# Altium footprint library ubloxLib.PcbLib: 23 footprints (part 2 of 2)
Each footprint in its own frame and in the unit in brackets; x right, y up, seen from the top. Pads: shape width x height; smd on the part's side, far side on the other; paste and mask are expansions set on the pad; w line width, h text height; cw(c..) or ccw(c..) is an arc to the next point about the centre after c.
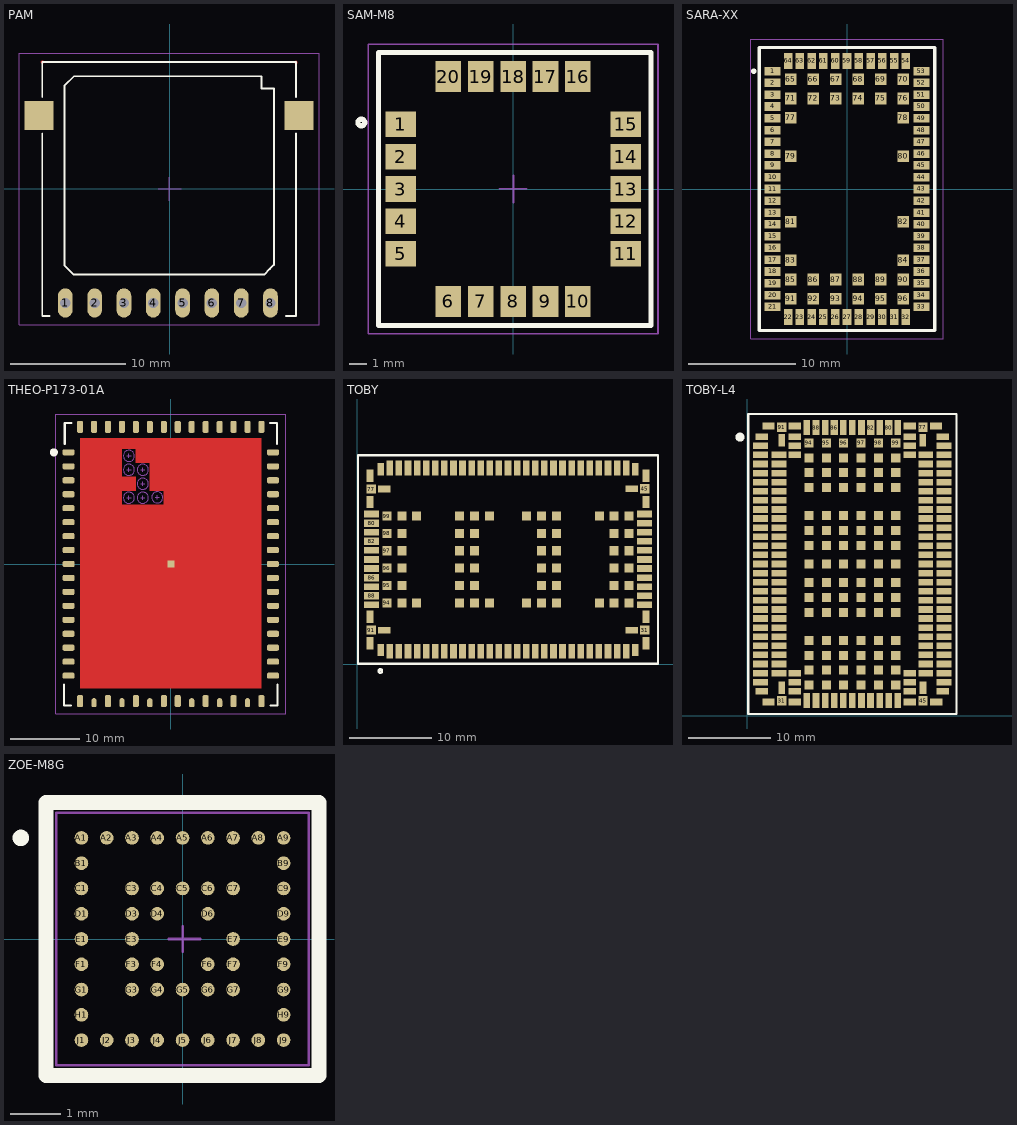
[diagram p1: the footprints below, top view; thin cyan lines are the x and y axes]

## PAM [mm] "u-blox PAM antenna module"
pads (10):
  oval 1.27x2.54 hole 0.9 paste-0.025: 1(-9.036,-9.876) 2(-6.496,-9.876) 3(-3.956,-9.876) 4(-1.416,-9.876) 5(1.124,-9.876) 6(3.664,-9.876) 7(6.204,-9.876) 8(8.744,-9.876)
  rect 2.5x2.5 smd paste-1.25: ""(-11.306,6.374) ""(11.204,6.374)
Top Layer:
  lines w0.254: -11.041,10.989 -10.991,10.989 ; 10.939,10.939 10.939,10.989
Top Overlay:
  lines w0.16: -11.036,4.799 -11.036,-11.001 -10.411,-11.001 ; -11.036,7.949 -11.036,10.999 10.964,10.999 10.964,7.949 ; 7.964,9.074 7.964,9.774 ; 7.964,9.149 7.964,8.699 9.039,8.699 9.039,-6.576 8.689,-6.926 8.195,-7.42 -8.292,-7.42 -9.111,-6.601 -9.111,8.949 -8.286,9.774 7.964,9.774 ; 10.089,-11.001 10.964,-11.001 10.964,4.799 ; 7.964,9.774 7.964,9.774
Mechanical 15:
  lines w0.1: -1,0.01 -0.01,0.01 ; -0.01,-1 -0.01,0.01 ; -0.01,1 -0.01,0.01 ; 1,0.01 -0.01,0.01 ; -13.051,-11.751 -13.051,11.749 12.949,11.749 12.949,-11.751 -13.051,-11.751
3D body "PAM.STEP": height 7.66, standoff -0.04, extent -11.036,-11.001 10.964,10.999

## SAM-M8 [mm] "ublox SAM antenna module"
pads (20):
  rect 1.8x1.5 smd paste-1.8: 1(-6.6,3.8) 2(-6.6,1.9) 3(-6.6,0) 4(-6.6,-1.9) 5(-6.6,-3.8) 11(6.6,-3.8) 12(6.6,-1.9) 13(6.6,0) 14(6.6,1.9) 15(6.6,3.8)
  rect 1.5x1.8 smd paste-1.8: 6(-3.8,-6.6) 7(-1.9,-6.6) 8(0,-6.6) 9(1.9,-6.6) 10(3.8,-6.6) 16(3.8,6.6) 17(1.9,6.6) 18(0,6.6) 19(-1.9,6.6) 20(-3.8,6.6)
Top Overlay:
  circle w0.3: c-8.9,3.9 r0.2
  lines w0.3: -7.9,-8 -7.9,0.125 -7.9,8 8.1,8 8.1,0.35 8.1,-8 -0.226,-8 -7.9,-8
Top Paste:
  region: 7.467,-0.136 6.748,-0.136 6.748,-0.716 7.467,-0.716
  region: 7.463,0.701 6.744,0.701 6.744,0.121 7.463,0.121
  region: 6.449,-0.132 5.73,-0.132 5.73,-0.712 6.449,-0.712
  region: 6.449,0.698 5.73,0.698 5.73,0.118 6.449,0.118
  region: 7.467,-3.933 6.748,-3.933 6.748,-4.513 7.467,-4.513
  region: 7.463,-3.096 6.744,-3.096 6.744,-3.676 7.463,-3.676
  region: 6.449,-3.929 5.73,-3.929 5.73,-4.509 6.449,-4.509
  region: 6.449,-3.099 5.73,-3.099 5.73,-3.679 6.449,-3.679
  region: -5.731,-0.136 -6.45,-0.136 -6.45,-0.716 -5.731,-0.716
  region: -5.735,0.701 -6.454,0.701 -6.454,0.121 -5.735,0.121
  region: -6.749,-0.132 -7.468,-0.132 -7.468,-0.712 -6.749,-0.712
  region: -6.749,0.698 -7.468,0.698 -7.468,0.118 -6.749,0.118
  region: 4.499,6.75 4.499,7.469 3.919,7.469 3.919,6.75
  region: 3.669,6.75 3.669,7.469 3.089,7.469 3.089,6.75
  region: 4.502,5.736 4.502,6.455 3.922,6.455 3.922,5.736
  region: 3.665,5.732 3.665,6.451 3.085,6.451 3.085,5.732
  region: 0.703,6.75 0.703,7.469 0.123,7.469 0.123,6.75
  region: -0.127,6.75 -0.127,7.469 -0.707,7.469 -0.707,6.75
  region: 0.706,5.736 0.706,6.455 0.126,6.455 0.126,5.736
  region: -0.131,5.732 -0.131,6.451 -0.711,6.451 -0.711,5.732
  region: -3.103,6.75 -3.103,7.469 -3.683,7.469 -3.683,6.75
  region: -3.933,6.75 -3.933,7.469 -4.513,7.469 -4.513,6.75
  region: -3.1,5.736 -3.1,6.455 -3.68,6.455 -3.68,5.736
  region: -3.937,5.732 -3.937,6.451 -4.517,6.451 -4.517,5.732
  region: 4.5,-6.455 4.5,-5.736 3.92,-5.736 3.92,-6.455
  region: 3.67,-6.455 3.67,-5.736 3.09,-5.736 3.09,-6.455
  region: 4.503,-7.469 4.503,-6.75 3.923,-6.75 3.923,-7.469
  region: 3.666,-7.473 3.666,-6.754 3.086,-6.754 3.086,-7.473
  region: 1.77,-7.464 1.77,-6.745 1.19,-6.745 1.19,-7.464
  region: 2.607,-7.46 2.607,-6.741 2.027,-6.741 2.027,-7.46
  region: 1.774,-6.446 1.774,-5.727 1.194,-5.727 1.194,-6.446
  region: 2.604,-6.446 2.604,-5.727 2.024,-5.727 2.024,-6.446
  region: -3.932,-7.473 -3.932,-6.754 -4.512,-6.754 -4.512,-7.473
  region: -3.095,-7.469 -3.095,-6.75 -3.675,-6.75 -3.675,-7.469
  region: -3.928,-6.455 -3.928,-5.736 -4.508,-5.736 -4.508,-6.455
  region: -3.098,-6.455 -3.098,-5.736 -3.678,-5.736 -3.678,-6.455
  region: -1.198,-6.448 -1.198,-5.729 -1.778,-5.729 -1.778,-6.448
  region: -2.028,-6.448 -2.028,-5.729 -2.608,-5.729 -2.608,-6.448
  region: -1.195,-7.462 -1.195,-6.743 -1.775,-6.743 -1.775,-7.462
  region: -2.032,-7.466 -2.032,-6.747 -2.612,-6.747 -2.612,-7.466
  region: 0.708,-6.455 0.708,-5.736 0.128,-5.736 0.128,-6.455
  region: -0.122,-6.455 -0.122,-5.736 -0.702,-5.736 -0.702,-6.455
  region: 0.711,-7.469 0.711,-6.75 0.131,-6.75 0.131,-7.469
  region: -0.126,-7.473 -0.126,-6.754 -0.706,-6.754 -0.706,-7.473
  region: -2.027,5.723 -2.027,6.442 -2.607,6.442 -2.607,5.723
  region: -1.19,5.727 -1.19,6.446 -1.77,6.446 -1.77,5.727
  region: -2.023,6.741 -2.023,7.46 -2.603,7.46 -2.603,6.741
  region: -1.193,6.741 -1.193,7.46 -1.773,7.46 -1.773,6.741
  region: 1.76,5.728 1.76,6.447 1.18,6.447 1.18,5.728
  region: 2.597,5.732 2.597,6.451 2.017,6.451 2.017,5.732
  region: 1.764,6.746 1.764,7.465 1.184,7.465 1.184,6.746
  region: 2.594,6.746 2.594,7.465 2.014,7.465 2.014,6.746
  region: -5.731,3.674 -6.45,3.674 -6.45,3.094 -5.731,3.094
  region: -5.735,4.511 -6.454,4.511 -6.454,3.931 -5.735,3.931
  region: -6.749,3.678 -7.468,3.678 -7.468,3.098 -6.749,3.098
  region: -6.749,4.508 -7.468,4.508 -7.468,3.928 -6.749,3.928
  region: -6.749,2.603 -7.468,2.603 -7.468,2.023 -6.749,2.023
  region: -6.749,1.773 -7.468,1.773 -7.468,1.193 -6.749,1.193
  region: -5.735,2.606 -6.454,2.606 -6.454,2.026 -5.735,2.026
  region: -5.731,1.769 -6.45,1.769 -6.45,1.189 -5.731,1.189
  region: -6.749,-1.203 -7.468,-1.203 -7.468,-1.783 -6.749,-1.783
  region: -6.749,-2.033 -7.468,-2.033 -7.468,-2.613 -6.749,-2.613
  region: -5.735,-1.2 -6.454,-1.2 -6.454,-1.78 -5.735,-1.78
  region: -5.731,-2.037 -6.45,-2.037 -6.45,-2.617 -5.731,-2.617
  region: -6.749,-3.099 -7.468,-3.099 -7.468,-3.679 -6.749,-3.679
  region: -6.749,-3.929 -7.468,-3.929 -7.468,-4.509 -6.749,-4.509
  region: -5.735,-3.096 -6.454,-3.096 -6.454,-3.676 -5.735,-3.676
  region: -5.731,-3.933 -6.45,-3.933 -6.45,-4.513 -5.731,-4.513
  region: 6.449,-1.203 5.73,-1.203 5.73,-1.783 6.449,-1.783
  region: 6.449,-2.033 5.73,-2.033 5.73,-2.613 6.449,-2.613
  region: 7.463,-1.2 6.744,-1.2 6.744,-1.78 7.463,-1.78
  region: 7.467,-2.037 6.748,-2.037 6.748,-2.617 7.467,-2.617
  region: 6.449,2.603 5.73,2.603 5.73,2.023 6.449,2.023
  region: 6.449,1.773 5.73,1.773 5.73,1.193 6.449,1.193
  region: 7.463,2.606 6.744,2.606 6.744,2.026 7.463,2.026
  region: 7.467,1.769 6.748,1.769 6.748,1.189 7.467,1.189
  region: 6.453,4.499 5.734,4.499 5.734,3.919 6.453,3.919
  region: 6.453,3.669 5.734,3.669 5.734,3.089 6.453,3.089
  region: 7.467,4.502 6.748,4.502 6.748,3.922 7.467,3.922
  region: 7.471,3.665 6.752,3.665 6.752,3.085 7.471,3.085
Mechanical 15:
  lines w0.1: -0.8,0.017 0.028,0.017 ; 0.028,-0.8 0.028,0.017 ; 0.028,0.8 0.028,0.017 ; 0.8,0.017 0.028,0.017 ; -8.5,-8.5 -8.5,8.5 8.5,8.5 8.5,-8.5 -8.5,-8.5
3D body "SAM_AP214.STEP": height 6.41, standoff 0.03, extent -7.7,-7.75 7.8,7.75

## SARA-XX [mm] "GSM/GPRS and GSM/EGPRS/HSPA Cellular Module"
height 3.25
pads (96):
  rect 1.5x0.8 smd paste-1: 1(-6.95,11) 2(-6.95,9.9) 3(-6.95,8.8) 4(-6.95,7.7) 5(-6.95,6.6) 6(-6.95,5.5) 7(-6.95,4.4) 8(-6.95,3.3) 9(-6.95,2.2) 10(-6.95,1.1) 11(-6.95,0) 12(-6.95,-1.1) 13(-6.95,-2.2) 14(-6.95,-3.3) 15(-6.95,-4.4) 16(-6.95,-5.5) 17(-6.95,-6.6) 18(-6.95,-7.7) 19(-6.95,-8.8) 20(-6.95,-9.9) 21(-6.95,-11) 33(6.95,-11) 34(6.95,-9.9) 35(6.95,-8.8) 36(6.95,-7.7) 37(6.95,-6.6) 38(6.95,-5.5) 39(6.95,-4.4) 40(6.95,-3.3) 41(6.95,-2.2) 42(6.95,-1.1) 43(6.95,0) 44(6.95,1.1) 45(6.95,2.2) 46(6.95,3.3) 47(6.95,4.4) 48(6.95,5.5) 49(6.95,6.6) 50(6.95,7.7) 51(6.95,8.8) 52(6.95,9.9) 53(6.95,11)
  rect 0.8x1.5 smd paste-1: 22(-5.5,-11.95) 23(-4.4,-11.95) 24(-3.3,-11.95) 25(-2.2,-11.95) 26(-1.1,-11.95) 27(0,-11.95) 28(1.1,-11.95) 29(2.2,-11.95) 30(3.3,-11.95) 31(4.4,-11.95) 32(5.5,-11.95) 54(5.5,11.95) 55(4.4,11.95) 56(3.3,11.95) 57(2.2,11.95) 58(1.1,11.95) 59(0,11.95) 60(-1.1,11.95) 61(-2.2,11.95) 62(-3.3,11.95) 63(-4.4,11.95) 64(-5.5,11.95)
  rect 1.1x1.1 smd paste-0.025: 65(-5.25,10.25) 66(-3.15,10.25) 67(-1.05,10.25) 68(1.05,10.25) 69(3.15,10.25) 70(5.25,10.25) 71(-5.25,8.45) 72(-3.15,8.45) 73(-1.05,8.45) 74(1.05,8.45) 75(3.15,8.45) 76(5.25,8.45) 77(-5.25,6.65) 78(5.25,6.65) 79(-5.25,3.05) 80(5.25,3.05) 81(-5.25,-3.05) 82(5.25,-3.05) 83(-5.25,-6.65) 84(5.25,-6.65) 85(-5.25,-8.45) 86(-3.15,-8.45) 87(-1.05,-8.45) 88(1.05,-8.45) 89(3.15,-8.45) 90(5.25,-8.45) 91(-5.25,-10.25) 92(-3.15,-10.25) 93(-1.05,-10.25) 94(1.05,-10.25) 95(3.15,-10.25) 96(5.25,-10.25)
Top Overlay:
  circle w0.4: c-8.7,11 r0.05
  lines w0.3: -8.2,-13.2 8.2,-13.2 8.2,13.2 -8.2,13.2 -8.2,-13.2
Top Paste:
  rectangle: -7.775,10.625 -6.225,11.375
  rectangle: -7.775,9.525 -6.225,10.275
  rectangle: -7.775,8.425 -6.225,9.175
  rectangle: -7.775,7.325 -6.225,8.075
  rectangle: -7.775,6.225 -6.225,6.975
  rectangle: -7.775,5.125 -6.225,5.875
  rectangle: -7.775,4.025 -6.225,4.775
  rectangle: -7.775,2.925 -6.225,3.675
  rectangle: -7.775,1.825 -6.225,2.575
  rectangle: -7.775,0.725 -6.225,1.475
  rectangle: -7.775,-0.375 -6.225,0.375
  rectangle: -7.775,-1.475 -6.225,-0.725
  rectangle: -7.775,-2.575 -6.225,-1.825
  rectangle: -7.775,-3.675 -6.225,-2.925
  rectangle: -7.775,-4.775 -6.225,-4.025
  rectangle: -7.775,-5.875 -6.225,-5.125
  rectangle: -7.775,-6.975 -6.225,-6.225
  rectangle: -7.775,-8.075 -6.225,-7.325
  rectangle: -7.775,-9.175 -6.225,-8.425
  rectangle: -7.775,-10.275 -6.225,-9.525
  rectangle: -7.775,-11.375 -6.225,-10.625
  region: -5.125,-12.775 -5.125,-11.225 -5.875,-11.225 -5.875,-12.775
  region: -4.025,-12.775 -4.025,-11.225 -4.775,-11.225 -4.775,-12.775
  region: -2.925,-12.775 -2.925,-11.225 -3.675,-11.225 -3.675,-12.775
  region: -1.825,-12.775 -1.825,-11.225 -2.575,-11.225 -2.575,-12.775
  region: -0.725,-12.775 -0.725,-11.225 -1.475,-11.225 -1.475,-12.775
  region: 0.375,-12.775 0.375,-11.225 -0.375,-11.225 -0.375,-12.775
  region: 1.475,-12.775 1.475,-11.225 0.725,-11.225 0.725,-12.775
  region: 2.575,-12.775 2.575,-11.225 1.825,-11.225 1.825,-12.775
  region: 3.675,-12.775 3.675,-11.225 2.925,-11.225 2.925,-12.775
  region: 4.775,-12.775 4.775,-11.225 4.025,-11.225 4.025,-12.775
  region: 5.875,-12.775 5.875,-11.225 5.125,-11.225 5.125,-12.775
  rectangle: 6.225,-11.375 7.775,-10.625
  rectangle: 6.225,-10.275 7.775,-9.525
  rectangle: 6.225,-9.175 7.775,-8.425
  rectangle: 6.225,-8.075 7.775,-7.325
  rectangle: 6.225,-6.975 7.775,-6.225
  rectangle: 6.225,-5.875 7.775,-5.125
  rectangle: 6.225,-4.775 7.775,-4.025
  rectangle: 6.225,-3.675 7.775,-2.925
  rectangle: 6.225,-2.575 7.775,-1.825
  rectangle: 6.225,-1.475 7.775,-0.725
  rectangle: 6.225,-0.375 7.775,0.375
  rectangle: 6.225,0.725 7.775,1.475
  rectangle: 6.225,1.825 7.775,2.575
  rectangle: 6.225,2.925 7.775,3.675
  rectangle: 6.225,4.025 7.775,4.775
  rectangle: 6.225,5.125 7.775,5.875
  rectangle: 6.225,6.225 7.775,6.975
  rectangle: 6.225,7.325 7.775,8.075
  rectangle: 6.225,8.425 7.775,9.175
  rectangle: 6.225,9.525 7.775,10.275
  rectangle: 6.225,10.625 7.775,11.375
  region: 4.775,11.225 4.775,12.775 4.025,12.775 4.025,11.225
  region: 3.675,11.225 3.675,12.775 2.925,12.775 2.925,11.225
  region: 2.575,11.225 2.575,12.775 1.825,12.775 1.825,11.225
  region: 5.875,11.225 5.875,12.775 5.125,12.775 5.125,11.225
  region: 1.475,11.225 1.475,12.775 0.725,12.775 0.725,11.225
  region: 0.375,11.225 0.375,12.775 -0.375,12.775 -0.375,11.225
  region: -0.725,11.225 -0.725,12.775 -1.475,12.775 -1.475,11.225
  region: -1.825,11.225 -1.825,12.775 -2.575,12.775 -2.575,11.225
  region: -2.925,11.225 -2.925,12.775 -3.675,12.775 -3.675,11.225
  region: -4.025,11.225 -4.025,12.775 -4.775,12.775 -4.775,11.225
  region: -5.125,11.225 -5.125,12.775 -5.875,12.775 -5.875,11.225
Mechanical 15:
  lines w0.05: -9,-14 9,-14 9,14 -9,14 -9,-14
3D body "SARA.STEP": height 3.13, standoff 0.13, extent -8,-13 8,13
3D body "SARA.STEP": height 0.13, standoff -2.87, extent -8,-13.05 8,12.95

## THEO-P173-01A [mm] "Host-based V2X transceiver module"
height 3.5
pads (69):
  rrect50% 1.7x0.87 smd: 1(-14.65,16) 2(-14.65,14) 3(-14.65,12) 4(-14.65,10) 5(-14.65,8) 6(-14.65,6) 7(-14.65,4) 8(-14.65,2) 9(-14.65,0) 10(-14.65,-2) 11(-14.65,-4) 12(-14.65,-6) 13(-14.65,-8) 14(-14.65,-10) 15(-14.65,-12) 16(-14.65,-14) 17(-14.65,-16) 32(14.65,-16) 33(14.65,-14) 34(14.65,-12) 35(14.65,-10) 36(14.65,-8) 37(14.65,-6) 38(14.65,-4) 39(14.65,-2) 40(14.65,0) 41(14.65,2) 42(14.65,4) 43(14.65,6) 44(14.65,8) 45(14.65,10) 46(14.65,12) 47(14.65,14) 48(14.65,16)
  rrect50% 0.87x1.7 smd: 18(-13,-19.65) 20(-9,-19.65) 22(-5,-19.65) 24(-1,-19.65) 25(1,-19.65) 27(5,-19.65) 29(9,-19.65) 31(13,-19.65) 49(13,19.65) 50(11,19.65) 51(9,19.65) 52(7,19.65) 53(5,19.65) 54(3,19.65) 55(1,19.65) 56(-1,19.65) 57(-3,19.65) 58(-5,19.65) 59(-7,19.65) 60(-9,19.65) 61(-11,19.65) 62(-13,19.65)
  rrect50% 0.76x1.1 smd: 19(-11,-19.95) 21(-7,-19.95) 23(-3,-19.95) 26(3,-19.95) 28(7,-19.95) 30(11,-19.95)
  round 0.76 smd: 19(-11,-19.6) 21(-7,-19.6) 23(-3,-19.6) 26(3,-19.6) 28(7,-19.6) 30(11,-19.6)
  rect 1x1 smd paste-1: GND_TAB(0,0)
Top Layer:
  region: -13,18 13,18 13,-17.8 -1,-17.8 -1,10.5 -3,10.5 -3,14.5 -5,14.5 -5,16.5 -7,16.5 -7,12.5 -5,12.5 -5,10.5 -7,10.5 -7,8.5 -1,8.5 -1,-17.8 -13,-17.8
Top Overlay:
  circle w0.635: c-16.754,16 r0.254
  lines w0.3: -15.3,-17.3 -15.3,-20.3 -14.3,-20.3 ; -15.2,17.2 -15.2,20.2 -14.2,20.2 ; 14.2,20.2 15.2,20.2 15.2,17.2 ; 14.3,-20.3 15.3,-20.3 15.3,-17.3
Top Paste:
  rectangle: -6.5,-2.3 -4.5,-0.3
  rectangle: -3.5,-2.3 -1.5,-0.3
  rectangle: -3.5,-5.3 -1.5,-3.3
  rectangle: -6.5,-5.3 -4.5,-3.3
  rectangle: -3.5,-8.3 -1.5,-6.3
  rectangle: -6.5,-8.3 -4.5,-6.3
  rectangle: -6.5,-17.3 -4.5,-15.3
  rectangle: -3.5,-17.3 -1.5,-15.3
  rectangle: -6.5,-14.3 -4.5,-12.3
  rectangle: -3.5,-14.3 -1.5,-12.3
  rectangle: -3.5,-11.3 -1.5,-9.3
  rectangle: -6.5,-11.3 -4.5,-9.3
  rectangle: -6.5,6.5 -4.5,8
  rectangle: -3.5,6.5 -1.5,8
  rectangle: -3.5,3.5 -1.5,5.5
  rectangle: -6.5,3.5 -4.5,5.5
  rectangle: -3.5,0.5 -1.5,2.5
  rectangle: -6.5,0.5 -4.5,2.5
  rectangle: -6.5,11 -5.5,11.5
  rectangle: -2.5,12.5 -1.5,14.5
  rectangle: -3.5,15.5 -1.5,17.5
  rectangle: -6.5,17 -4.5,17.5
  rectangle: -12.5,15.5 -10.5,17.5
  rectangle: -9.5,15.5 -7.5,17.5
  rectangle: -9.5,12.5 -7.5,14.5
  rectangle: -12.5,12.5 -10.5,14.5
  rectangle: -9.5,9.5 -7.5,11.5
  rectangle: -12.5,9.5 -10.5,11.5
  rectangle: -12.5,0.5 -10.5,2.5
  rectangle: -9.5,0.5 -7.5,2.5
  rectangle: -12.5,3.5 -10.5,5.5
  rectangle: -9.5,3.5 -7.5,5.5
  rectangle: -9.5,6.5 -7.5,8.5
  rectangle: -12.5,6.5 -10.5,8.5
  rectangle: -12.5,-11.3 -10.5,-9.3
  rectangle: -9.5,-11.3 -7.5,-9.3
  rectangle: -9.5,-14.3 -7.5,-12.3
  rectangle: -12.5,-14.3 -10.5,-12.3
  rectangle: -9.5,-17.3 -7.5,-15.3
  rectangle: -12.5,-17.3 -10.5,-15.3
  rectangle: -12.5,-8.3 -10.5,-6.3
  rectangle: -9.5,-8.3 -7.5,-6.3
  rectangle: -12.5,-5.3 -10.5,-3.3
  rectangle: -9.5,-5.3 -7.5,-3.3
  rectangle: -9.5,-2.3 -7.5,-0.3
  rectangle: -12.5,-2.3 -10.5,-0.3
  rectangle: -2.5,11 -1.5,11.5
  rectangle: 7.5,15.5 9.5,17.5
  rectangle: 10.5,15.5 12.5,17.5
  rectangle: 10.5,12.5 12.5,14.5
  rectangle: 7.5,12.5 9.5,14.5
  rectangle: 10.5,9.5 12.5,11.5
  rectangle: 7.5,9.5 9.5,11.5
  rectangle: 7.5,0.5 9.5,2.5
  rectangle: 10.5,0.5 12.5,2.5
  rectangle: 7.5,3.5 9.5,5.5
  rectangle: 10.5,3.5 12.5,5.5
  rectangle: 10.5,6.5 12.5,8.5
  rectangle: 7.5,6.5 9.5,8.5
  rectangle: 7.5,-11.3 9.5,-9.3
  rectangle: 10.5,-11.3 12.5,-9.3
  rectangle: 10.5,-14.3 12.5,-12.3
  rectangle: 7.5,-14.3 9.5,-12.3
  rectangle: 10.5,-17.3 12.5,-15.3
  rectangle: 7.5,-17.3 9.5,-15.3
  rectangle: 7.5,-8.3 9.5,-6.3
  rectangle: 10.5,-8.3 12.5,-6.3
  rectangle: 7.5,-5.3 9.5,-3.3
  rectangle: 10.5,-5.3 12.5,-3.3
  rectangle: 10.5,-2.3 12.5,-0.3
  rectangle: 7.5,-2.3 9.5,-0.3
  rectangle: 1.5,15.5 3.5,17.5
  rectangle: 4.5,15.5 6.5,17.5
  rectangle: 4.5,12.5 6.5,14.5
  rectangle: 1.5,12.5 3.5,14.5
  rectangle: 4.5,9.5 6.5,11.5
  rectangle: 1.5,9.5 3.5,11.5
  rectangle: 1.5,0.5 3.5,2.5
  rectangle: 4.5,0.5 6.5,2.5
  rectangle: 1.5,3.5 3.5,5.5
  rectangle: 4.5,3.5 6.5,5.5
  rectangle: 4.5,6.5 6.5,8.5
  rectangle: 1.5,6.5 3.5,8.5
  rectangle: 1.5,-11.3 3.5,-9.3
  rectangle: 4.5,-11.3 6.5,-9.3
  rectangle: 4.5,-14.3 6.5,-12.3
  rectangle: 1.5,-14.3 3.5,-12.3
  rectangle: 4.5,-17.3 6.5,-15.3
  rectangle: 1.5,-17.3 3.5,-15.3
  rectangle: 1.5,-8.3 3.5,-6.3
  rectangle: 4.5,-8.3 6.5,-6.3
  rectangle: 1.5,-5.3 3.5,-3.3
  rectangle: 4.5,-5.3 6.5,-3.3
  rectangle: 4.5,-2.3 6.5,-0.3
  rectangle: 1.5,-2.3 3.5,-0.3
  rectangle: -0.5,15.5 0.5,17.5
  rectangle: -0.5,12.5 0.5,14.5
  rectangle: -0.5,6.5 0.5,8.5
  rectangle: -0.5,9.5 0.5,11.5
  rectangle: -0.5,-2.3 0.5,-0.3
  rectangle: -0.5,-5.3 0.5,-3.3
  rectangle: -0.5,0.5 0.5,2.5
  rectangle: -0.5,3.5 0.5,5.5
  rectangle: -0.5,-14.3 0.5,-12.3
  rectangle: -0.5,-17.3 0.5,-15.3
  rectangle: -0.5,-11.3 0.5,-9.3
  rectangle: -0.5,-8.3 0.5,-6.3
Top Solder:
  region: -13.1,18.1 13.1,18.1 13.1,-17.9 -0.8,-17.9 -0.8,10.7 -2.8,10.7 -2.8,14.7 -4.8,14.7 -4.8,16.7 -7.2,16.7 -7.2,12.3 -5.2,12.3 -5.2,10.7 -7.2,10.7 -7.2,8.3 -0.8,8.3 -0.8,-17.9 -13.1,-17.9
Mechanical 13:
  circle w0.025: c-4,13.5 r0.8
  circle w0.025: c-4,9.5 r0.8
  circle w0.025: c-1.95,9.55 r0.8
  circle w0.025: c-6,9.5 r0.8
  circle w0.025: c-4,11.5 r0.8
  circle w0.025: c-6,13.5 r0.8
  circle w0.025: c-6,15.5 r0.8
  circle w0.025: c0,0 r0.762
  lines w0.025: -6.3,9.5 -5.7,9.5 ; -6.3,13.5 -5.7,13.5 ; -6.3,15.5 -5.7,15.5 ; -6,9.2 -6,9.8 ; -6,13.2 -6,13.8 ; -6,15.2 -6,15.8 ; -4.3,9.5 -3.7,9.5 ; -4.3,11.5 -3.7,11.5 ; -4.3,13.5 -3.7,13.5 ; -4,9.2 -4,9.8 ; -4,11.2 -4,11.8 ; -4,13.2 -4,13.8 ; -2.25,9.55 -1.65,9.55 ; -1.95,9.25 -1.95,9.85 ; -0.762,0 0.762,0 ; 0,-0.762 0,0.762
Mechanical 15:
  lines w0.05: -16.5,-21.5 -16.5,21.5 16.5,21.5 16.5,-21.5 -16.5,-21.5
3D body "THEO-P173-01A.stp": height 3.84, standoff -0.03, extent -15,-20 15,20

## TOBY [mm] "TOBY cellular module"
pads (152):
  rect 0.8x1.5 smd paste+0 mask+0.05: 1(2.85,1.75) 29(33.65,1.75) 47(33.65,23.625) 75(2.85,23.625)
  rect 0.8x1.8 smd paste-0.025 mask+0.05: 2(3.95,1.6) 3(5.05,1.6) 4(6.15,1.6) 5(7.25,1.6) 6(8.35,1.6) 7(9.45,1.6) 8(10.55,1.6) 9(11.65,1.6) 10(12.75,1.6) 11(13.85,1.6) 12(14.95,1.6) 13(16.05,1.6) 14(17.15,1.6) 15(18.25,1.6) 16(19.35,1.6) 17(20.45,1.6) 18(21.55,1.6) 19(22.65,1.6) 20(23.75,1.6) 21(24.85,1.6) 22(25.95,1.6) 23(27.05,1.6) 24(28.15,1.6) 25(29.25,1.6) 26(30.35,1.6) 27(31.45,1.6) 28(32.55,1.6) 48(32.55,23.775) 49(31.45,23.775) 50(30.35,23.775) 51(29.25,23.775) 52(28.15,23.775) 53(27.05,23.775) 54(25.95,23.775) 55(24.85,23.775) 56(23.75,23.775) 57(22.65,23.775) 58(21.55,23.775) 59(20.45,23.775) 60(19.35,23.775) 61(18.25,23.775) 62(17.15,23.775) 63(16.05,23.775) 64(14.95,23.775) 65(13.85,23.775) 66(12.75,23.775) 67(11.65,23.775) 68(10.55,23.775) 69(9.45,23.775) 70(8.35,23.775) 71(7.25,23.775) 72(6.15,23.775) 73(5.05,23.775) 74(3.95,23.775)
  rect 0.8x1.5 smd paste+0.025 mask+0.05: 30(34.95,2.55) 32(34.95,5.75) 44(34.95,19.65) 46(34.95,22.85) 76(1.55,22.825) 78(1.55,19.65) 90(1.55,5.75) 92(1.55,2.55)
  rect 1.1x1.1 smd paste+0.025 mask+0.05: 31(34.8,4.15) 45(34.8,21.25) 77(1.7,21.225) 91(1.7,4.15)
  rect 1.8x0.8 smd paste-0.025 mask+0.05: 33(34.75,7.2) 34(34.75,8.3) 35(34.75,9.4) 36(34.75,10.5) 37(34.75,11.6) 38(34.75,12.7) 39(34.75,13.8) 40(34.75,14.9) 41(34.75,16) 42(34.75,17.1) 43(34.75,18.2) 79(1.75,18.2) 81(1.75,16) 83(1.75,13.8) 84(1.75,12.7) 85(1.75,11.6) 87(1.75,9.4) 89(1.75,7.2)
  rect 1.8x0.9 smd paste-0.025 mask+0.05: 80(1.75,17.1) 82(1.75,14.9) 86(1.75,10.5) 88(1.75,8.3)
  rect 1.5x0.8 smd paste+0.025 mask+0.05: 93(3.3,4.15) 100(3.3,21.225) 145(33.2,4.15) 152(33.2,21.25)
  rect 1.1x1.1 smd paste-0.025 mask+0.05: 94(3.6,7.45) 95(3.6,9.55) 96(3.6,11.65) 97(3.6,13.75) 98(3.6,15.85) 99(3.6,17.95) 101(5.4,7.45) 102(5.4,9.55) 103(5.4,11.65) 104(5.4,13.75) 105(5.4,15.85) 106(5.4,17.95) 107(7.2,7.45) 108(7.2,17.95) 109(12.4,7.45) 110(12.4,9.55) 111(12.4,11.65) 112(12.4,13.75) 113(12.4,15.85) 114(12.4,17.95) 115(14.2,7.45) 116(14.2,9.55) 117(14.2,11.65) 118(14.2,13.75) 119(14.2,15.85) 120(14.2,17.95) 121(16,7.45) 122(16,17.95) 123(20.5,7.45) 124(20.5,17.95) 125(22.3,7.45) 126(22.3,9.55) 127(22.3,11.65) 128(22.3,13.75) 129(22.3,15.85) 130(22.3,17.95) 131(24.1,7.45) 132(24.1,9.55) 133(24.1,11.65) 134(24.1,13.75) 135(24.1,15.85) 136(24.1,17.95) 137(29.3,7.45) 138(29.3,17.95) 139(31.1,7.45) 140(31.1,9.55) 141(31.1,11.65) 142(31.1,13.75) 143(31.1,15.85) 144(31.1,17.95) 146(32.9,7.45) 147(32.9,9.55) 148(32.9,11.65) 149(32.9,13.75) 150(32.9,15.85) 151(32.9,17.95)
Top Overlay:
  circle w0.3: c2.8,-0.8 r0.2
  lines w0.3: 0.1,0.1 0.1,25.3 36.4,25.3 36.4,0.1 0.1,0.1
3D body "TOBY.STEP": height 2.6, standoff 0, extent 0.35,0.3 36.15,25.1

## TOBY-L4 [mm] "TOBY cellular module"
pads (248):
  rect 1.5x0.8 smd paste+0 mask+0.05: 1(1.75,33.75) 29(1.75,2.95) 47(23.625,2.95) 75(23.625,33.75)
  rect 1.8x0.8 smd paste-0.025 mask+0.05: 2(1.6,32.65) 3(1.6,31.55) 4(1.6,30.45) 5(1.6,29.35) 6(1.6,28.25) 7(1.6,27.15) 8(1.6,26.05) 9(1.6,24.95) 10(1.6,23.85) 11(1.6,22.75) 12(1.6,21.65) 13(1.6,20.55) 14(1.6,19.45) 15(1.6,18.35) 16(1.6,17.25) 17(1.6,16.15) 18(1.6,15.05) 19(1.6,13.95) 20(1.6,12.85) 21(1.6,11.75) 22(1.6,10.65) 23(1.6,9.55) 24(1.6,8.45) 25(1.6,7.35) 26(1.6,6.25) 27(1.6,5.15) 28(1.6,4.05) 48(23.775,4.05) 49(23.775,5.15) 50(23.775,6.25) 51(23.775,7.35) 52(23.775,8.45) 53(23.775,9.55) 54(23.775,10.65) 55(23.775,11.75) 56(23.775,12.85) 57(23.775,13.95) 58(23.775,15.05) 59(23.775,16.15) 60(23.775,17.25) 61(23.775,18.35) 62(23.775,19.45) 63(23.775,20.55) 64(23.775,21.65) 65(23.775,22.75) 66(23.775,23.85) 67(23.775,24.95) 68(23.775,26.05) 69(23.775,27.15) 70(23.775,28.25) 71(23.775,29.35) 72(23.775,30.45) 73(23.775,31.55) 74(23.775,32.65) 199(3.8,31.55) 200(3.8,30.45) 201(3.8,29.35) 202(3.8,28.25) 203(3.8,27.15) 204(3.8,26.05) 205(3.8,24.95) 206(3.8,23.85) 207(3.8,22.75) 208(3.8,21.65) 209(3.8,20.55) 210(3.8,19.45) 211(3.8,18.35) 212(3.8,17.25) 213(3.8,16.15) 214(3.8,15.05) 215(3.8,13.95) 216(3.8,12.85) 217(3.8,11.75) 218(3.8,10.65) 219(3.8,9.55) 220(3.8,8.45) 221(3.8,7.35) 222(3.8,6.25) 223(3.8,5.15) 224(21.575,5.15) 225(21.575,6.25) 226(21.575,7.35) 227(21.575,8.45) 228(21.575,9.55) 229(21.575,10.65) 230(21.575,11.75) 231(21.575,12.85) 232(21.575,13.95) 233(21.575,15.05) 234(21.575,16.15) 235(21.575,17.25) 236(21.575,18.35) 237(21.575,19.45) 238(21.575,20.55) 239(21.575,21.65) 240(21.575,22.75) 241(21.575,23.85) 242(21.575,24.95) 243(21.575,26.05) 244(21.575,27.15) 245(21.575,28.25) 246(21.575,29.35) 247(21.575,30.45) 248(21.575,31.55)
  rect 1.5x0.8 smd paste+0.025 mask+0.05: 30(2.55,1.65) 32(5.75,1.65) 44(19.65,1.65) 46(22.85,1.65) 76(22.825,35.05) 78(19.65,35.05) 90(5.75,35.05) 92(2.55,35.05) 153(5.75,33.75) 154(19.65,33.75) 155(5.75,32.65) 156(19.65,32.65) 157(5.75,31.55) 158(19.65,31.55) 193(5.75,5.15) 194(19.65,5.15) 195(5.75,4.05) 196(19.65,4.05) 197(5.75,2.95) 198(19.65,2.95)
  rect 1.1x1.1 smd paste+0.025 mask+0.05: 31(4.15,1.8) 45(21.25,1.8) 77(21.225,34.9) 91(4.15,34.9)
  rect 0.8x1.8 smd paste-0.025 mask+0.05: 33(7.2,1.85) 34(8.3,1.85) 35(9.4,1.85) 36(10.5,1.85) 37(11.6,1.85) 38(12.7,1.85) 39(13.8,1.85) 40(14.9,1.85) 41(16,1.85) 42(17.1,1.85) 43(18.2,1.85) 79(18.2,34.85) 81(16,34.85) 83(13.8,34.85) 84(12.7,34.85) 85(11.6,34.85) 87(9.4,34.85) 89(7.2,34.85)
  rect 0.9x1.8 smd paste-0.025 mask+0.05: 80(17.1,34.85) 82(14.9,34.85) 86(10.5,34.85) 88(8.3,34.85)
  rect 0.8x1.5 smd paste+0.025 mask+0.05: 93(4.15,33.3) 100(21.225,33.3) 145(4.15,3.4) 152(21.25,3.4)
  rect 1.1x1.1 smd paste-0.025 mask+0.05: 94(7.45,33) 95(9.55,33) 96(11.65,33) 97(13.75,33) 98(15.85,33) 99(17.95,33) 101(7.45,31.2) 102(9.55,31.2) 103(11.65,31.2) 104(13.75,31.2) 105(15.85,31.2) 106(17.95,31.2) 107(7.45,29.4) 108(17.95,29.4) 109(7.45,24.2) 110(9.55,24.2) 111(11.65,24.2) 112(13.75,24.2) 113(15.85,24.2) 114(17.95,24.2) 115(7.45,22.4) 116(9.55,22.4) 117(11.65,22.4) 118(13.75,22.4) 119(15.85,22.4) 120(17.95,22.4) 121(7.45,20.6) 122(17.95,20.6) 123(7.45,16.1) 124(17.95,16.1) 125(7.45,14.3) 126(9.55,14.3) 127(11.65,14.3) 128(13.75,14.3) 129(15.85,14.3) 130(17.95,14.3) 131(7.45,12.5) 132(9.55,12.5) 133(11.65,12.5) 134(13.75,12.5) 135(15.85,12.5) 136(17.95,12.5) 137(7.45,7.3) 138(17.95,7.3) 139(7.45,5.5) 140(9.55,5.5) 141(11.65,5.5) 142(13.75,5.5) 143(15.85,5.5) 144(17.95,5.5) 146(7.45,3.7) 147(9.55,3.7) 148(11.65,3.7) 149(13.75,3.7) 150(15.85,3.7) 151(17.95,3.7) 159(9.55,29.4) 160(11.65,29.4) 161(13.75,29.4) 162(15.85,29.4) 163(7.45,27.6) 164(9.55,27.6) 165(11.65,27.6) 166(13.75,27.6) 167(15.85,27.6) 168(17.95,27.6) 169(9.55,20.6) 170(11.65,20.6) 171(13.75,20.6) 172(15.85,20.6) 173(7.45,18.35) 174(9.55,18.35) 175(11.65,18.35) 176(13.75,18.35) 177(15.85,18.35) 178(17.95,18.35) 179(9.55,16.1) 180(11.65,16.1) 181(13.75,16.1) 182(15.85,16.1) 183(7.45,9.1) 184(9.55,9.1) 185(11.65,9.1) 186(13.75,9.1) 187(15.85,9.1) 188(17.95,9.1) 189(9.55,7.3) 190(11.65,7.3) 191(13.75,7.3) 192(15.85,7.3)
Top Overlay:
  circle w0.5: c-0.9,33.7 r0.3
  lines w0.3: 0.1,0.2 25.3,0.2 25.3,36.5 0.1,36.5 0.1,0.2
3D body "TOBY-L4.STEP": height 2.6, standoff 0, extent 0.3,0.45 25.1,36.25

## ZOE-M8G [mm]
pads (51):
  round 0.27 smd mask+0.05: A1(-2,2) A2(-1.5,2) A3(-1,2) A4(-0.5,2) A5(0,2) A6(0.5,2) A7(1,2) A8(1.5,2) A9(2,2) B1(-2,1.5) B9(2,1.5) C1(-2,1) C3(-1,1) C4(-0.5,1) C5(0,1) C6(0.5,1) C7(1,1) C9(2,1) D1(-2,0.5) D3(-1,0.5) D4(-0.5,0.5) D6(0.5,0.5) D9(2,0.5) E1(-2,0) E3(-1,0) E7(1,0) E9(2,0) F1(-2,-0.5) F3(-1,-0.5) F4(-0.5,-0.5) F6(0.5,-0.5) F7(1,-0.5) F9(2,-0.5) G1(-2,-1) G3(-1,-1) G4(-0.5,-1) G5(0,-1) G6(0.5,-1) G7(1,-1) G9(2,-1) H1(-2,-1.5) H9(2,-1.5) J1(-2,-2) J2(-1.5,-2) J3(-1,-2) J4(-0.5,-2) J5(0,-2) J6(0.5,-2) J7(1,-2) J8(1.5,-2) J9(2,-2)
Top Overlay:
  circle w0.254: c-3.2,2 r0.035
  lines w0.3: -2.7,-2.7 2.7,-2.7 2.7,2.7 -2.7,2.7 -2.7,-2.7
Mechanical 15:
  lines w0.05: -0.275,0 0,0 ; 0,-0.25 0,0 ; 0,0 0,0.25 0,0 ; 0,0 0.35,0 0,0 ; -2.5,-2.5 -2.5,2.5 2.5,2.5 2.5,-2.5 -2.5,-2.5
3D body "ZOE_S-LGA51 (STEP-AP214).STEP": height 1.04, standoff 0, extent -2.2,-2.25 2.3,2.25